# Altium footprint library projects.PcbLib: 23 footprints (part 2 of 2)
Each footprint in its own frame and in the unit in brackets; x right, y up, seen from the top. Pads: shape width x height; smd on the part's side, far side on the other; paste and mask are expansions set on the pad; w line width, h text height; cw(c..) or ccw(c..) is an arc to the next point about the centre after c.
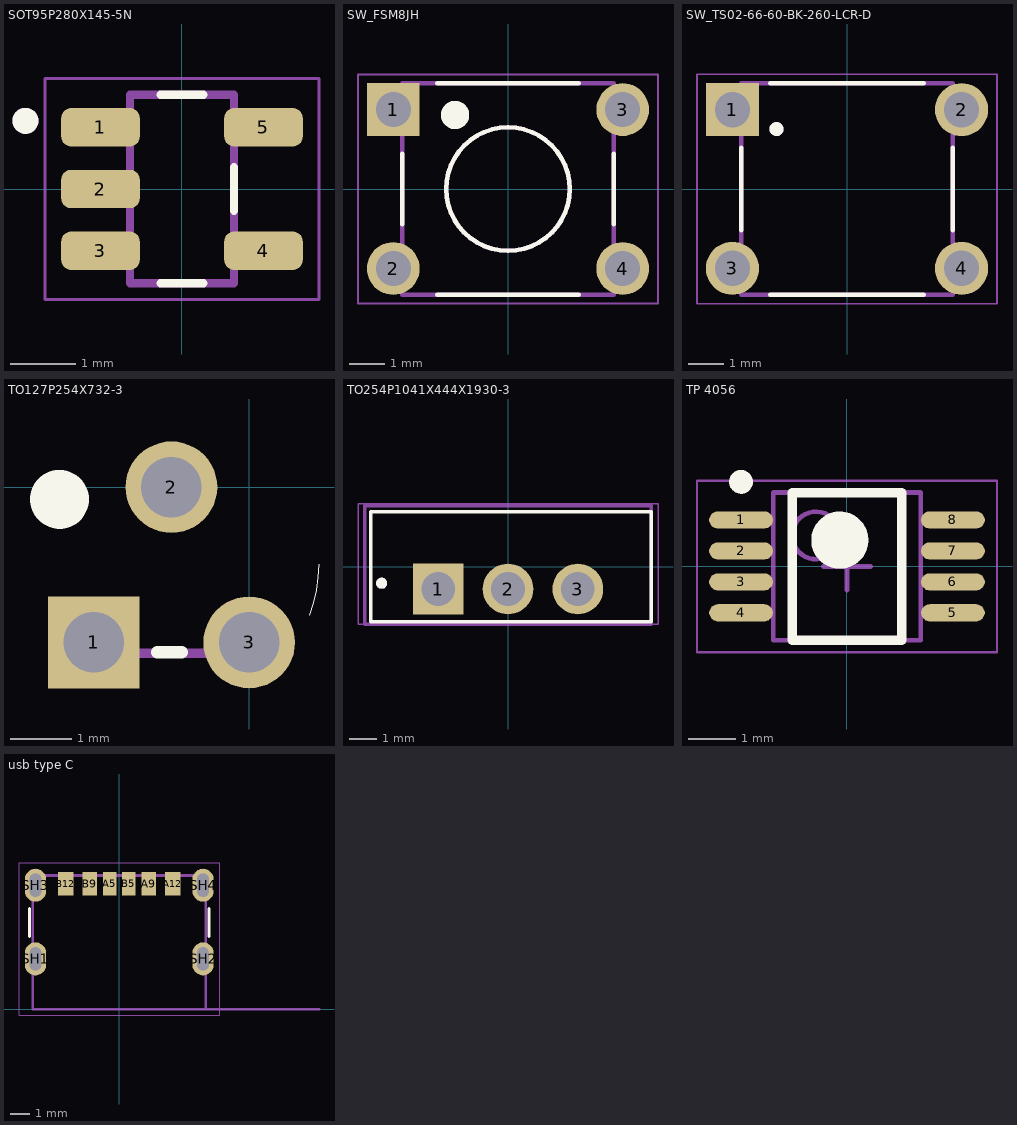
[diagram p1: the footprints below, top view; thin cyan lines are the x and y axes]

## SOT95P280X145-5N [mm]
pads (5):
  rrect50% 1.21x0.59 smd: 1(-1.255,0.95) 2(-1.255,0) 3(-1.255,-0.95) 4(1.255,-0.95) 5(1.255,0.95)
Top Overlay:
  circle w0.2: c-2.41,1.05 r0.1
  lines w0.127: -0.33,-1.45 0.33,-1.45 ; -0.33,1.45 0.33,1.45 ; 0.8,-0.335 0.8,0.335
Mechanical 13:
  circle w0.2: c-2.41,1.05 r0.1
  lines w0.127: -0.8,-1.45 0.8,-1.45 0.8,1.45 -0.8,1.45 -0.8,-1.45
Mechanical 15:
  lines w0.05: -2.11,-1.7 -2.11,1.7 2.11,1.7 2.11,-1.7 -2.11,-1.7
3D body "step_temp.STEP": height 1.45, standoff 0, extent -1.4,-1.45 1.4,1.45

## SW_FSM8JH [mm]
pads (4):
  rect 1.498x1.498 / inner round 1.498 / far side rect 1.498x1.498 hole 0.99: 1(-3.25,2.25)
  round 1.498 hole 0.99: 2(-3.25,-2.25) 3(3.25,2.25) 4(3.25,-2.25)
Top Overlay:
  circle w0.4: c-1.5,2.1 r0.2
  circle w0.127: c0,0 r1.75
  lines w0.127: -3,-1 -3,1 ; -2,-3 2,-3 ; -2,3 2,3 ; 3,-1 3,1
Mechanical 13:
  circle w0.4: c-3.25,2.25 r0.2
  circle w0.127: c0,0 r1.75
  lines w0.127: -2.995,-2.995 2.995,-2.995 2.995,2.995 -2.995,2.995 -2.995,-2.995
Mechanical 15:
  lines w0.05: -4.25,-3.245 -4.25,3.25 4.25,3.25 4.25,-3.245 -4.25,-3.245
3D body "step_temp.STEP": height 9.5, standoff -3.51, extent -2.997,-3.946 2.997,3.946

## SW_TS02-66-60-BK-260-LCR-D [mm]
pads (4):
  rect 1.508x1.508 / inner round 1.508 / far side rect 1.508x1.508 hole 1: 1(-3.25,2.25)
  round 1.508 hole 1: 2(3.25,2.25) 3(-3.25,-2.25) 4(3.25,-2.25)
Top Overlay:
  circle w0.2: c-2,1.7 r0.1
  lines w0.127: -3,-1.176 -3,1.176 ; -2.176,-3 2.176,-3 ; -2.176,3 2.176,3 ; 3,-1.176 3,1.176
Mechanical 13:
  circle w0.2: c-2,1.7 r0.1
  lines w0.127: -3,-3 -3,3 3,3 3,-3 -3,-3
Mechanical 15:
  lines w0.05: -4.254,-3.254 4.254,-3.254 4.254,3.254 -4.254,3.254 -4.254,-3.254
3D body "step_temp.STEP": height 6, standoff -3.5, extent -3.95,-3 3.95,3

## TO127P254X732-3 [mil]
pads (3):
  rect 59x59 / inner round 59 / far side rect 59x59 hole 39: 1(-100,-100)
  round 59 hole 39: 2(-50,0) 3(0,-100)
Top Overlay:
  circle w30: c-122.05,-7.87 r3.94
  lines w0: 39.18,-82.52 ccw(c-51.58,-49.49) 45,-49.49
  lines w8: -59.06,-106.3 -43.31,-106.3
Mechanical 13:
  lines w6: -126,-107 26,-107
3D body "step_temp.STEP": height 209.84, standoff -614.96, extent -142.37,-116.26 45,26.26

## TO254P1041X444X1930-3 [mm]
pads (3):
  rect 1.845x1.845 / inner round 1.845 / far side rect 1.845x1.845 hole 1.23: 1(-2.54,-0.81)
  round 1.845 hole 1.23: 2(0,-0.81) 3(2.54,-0.81)
Top Overlay:
  circle w0.2: c-4.6,-0.6 r0.1
  lines w0.127: -5,-2 -5,2 5.208,2 5.208,-2 -5,-2
Mechanical 13:
  circle w0.2: c-4.6,-0.6 r0.1
  lines w0.127: -5.208,-2.1 -5.208,2.222 5.208,2.222 5.208,-2.1 -5.208,-2.1
Mechanical 15:
  lines w0.05: -5.457,-2.1 5.457,-2.1 5.457,2.3 -5.457,2.3 -5.457,-2.1
3D body "step_temp.STEP": height 19.3, standoff -10.03, extent -5.207,-2.222 5.207,2.222

## TP 4056 [mm]
height 1.1
pads (8):
  oval 1.34x0.36 smd mask+0.07: 1(-2.225,0.975) 2(-2.225,0.325) 3(-2.225,-0.325) 4(-2.225,-0.975) 5(2.225,-0.975) 6(2.225,-0.325) 7(2.225,0.325) 8(2.225,0.975)
Top Overlay:
  circle w0.25: c-2.225,1.775 r0.125
  circle w0.6: c-0.15,0.55 r0.3
  lines w0.2: -1.15,-1.55 -1.15,1.55 1.15,1.55 1.15,-1.55 -1.15,-1.55
Mechanical 13:
  circle w0.1: c-0.65,0.65 r0.5
  lines w0.1: -1.55,-1.55 -1.55,1.55 1.55,1.55 1.55,-1.55 -1.55,-1.55
Mechanical 15:
  lines w0.05: -3.15,-1.8 -3.15,1.8 3.15,1.8 3.15,-1.8 -3.15,-1.8
  lines w0.1: -0.5,0 0.5,0 ; 0,-0.5 0,0.5
3D body "SOP127P600-8N.step": height 1.25, standoff 0.15, extent -2.4,-1.55 2.5,1.55

## usb type C [mm]
height 3.26
pads (10):
  rect 0.7x1.2 smd mask+0.064: A5(-0.5,6.48) B5(0.5,6.48)
  rect 0.76x1.2 smd mask+0.064: A9(1.52,6.48) B9(-1.52,6.48)
  rect 0.8x1.2 smd mask+0.064: A12(2.75,6.48) B12(-2.75,6.48)
  oval 1.1x1.7 hole 0.6 slot 1.2 at 90 deg mask+0.064: SH1(-4.32,2.6) SH2(4.32,2.6) SH3(-4.32,6.4) SH4(4.32,6.4)
Top Overlay:
  lines w0.15: -4.62,3.75 -4.62,5.2 ; 4.62,3.75 4.62,5.2
Mechanical 12:
  text "PTH Slot 1.2 +/- 0.05 X 0.6 +/- 0.05" at -4.763,10.93 h0.5
Mechanical 13:
  lines w0.13: 10.3,0 4.47,0 ; 4.47,0 -4.47,0 -4.47,6.9 4.47,6.9 4.47,0
  text "PCB Edge" at 5.3,0.2 h1
Mechanical 15:
  lines w0.01: -5.17,-0.3 5.17,-0.3 5.17,7.55 -5.17,7.55 -5.17,-0.3
Mechanical 29:
  text ".Designator" at -1.092,3.183 h0.25
3D body "USB Connector Type C female 6pin.STEP": height 3.22, standoff -1, extent -4.47,-0.012 4.47,6.858